# Altium footprint library PcbLib1.PcbLib: 31 footprints (part 1 of 2)
Each footprint in its own frame and in the unit in brackets; x right, y up, seen from the top. Pads: shape width x height; smd on the part's side, far side on the other; paste and mask are expansions set on the pad; w line width, h text height; cw(c..) or ccw(c..) is an arc to the next point about the centre after c.
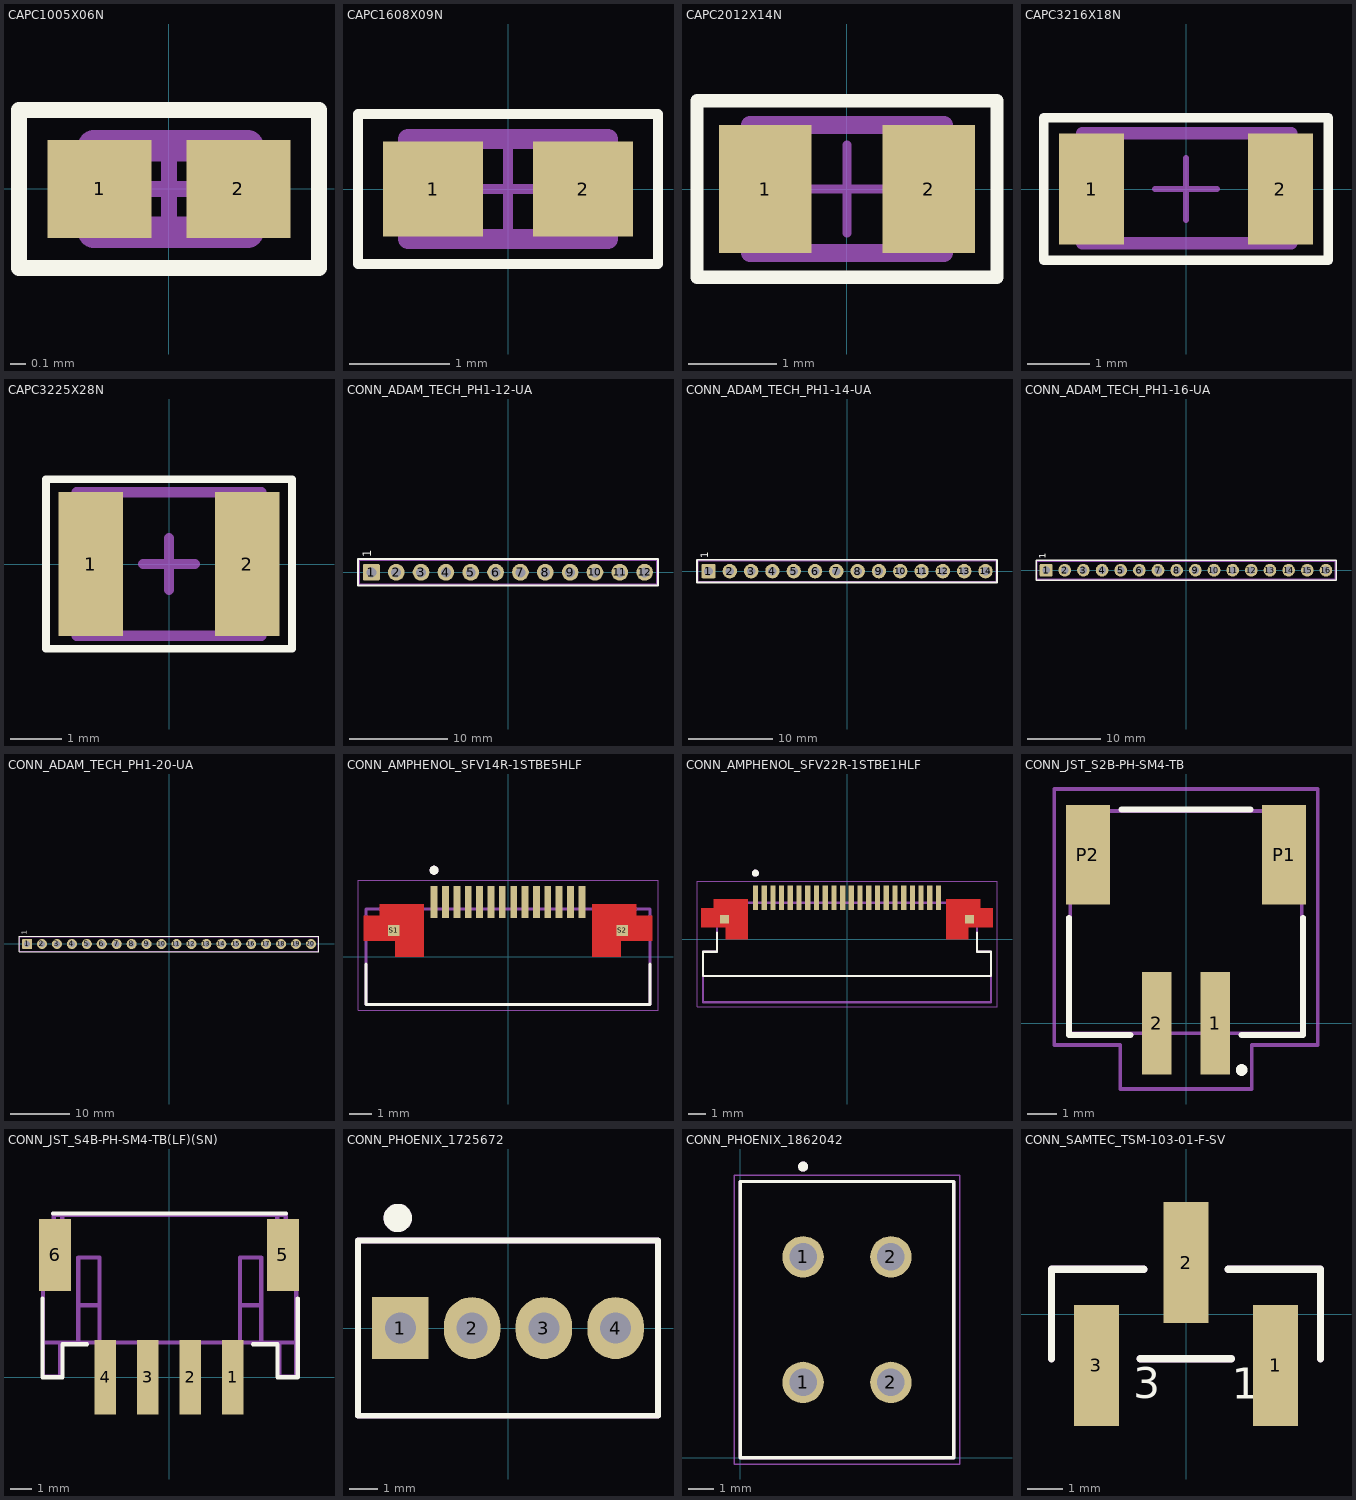
[diagram p0: the footprints below, top view; thin cyan lines are the x and y axes]

## CAPC1005X06N [mm] "Chip Capacitor, 2-Leads, Body 1.00x0.50mm, IPC Medium Density"
height 0.55
pads (2):
  rect 0.66x0.62 smd: 1(-0.44,0) 2(0.44,0)
Top Overlay:
  lines w0.1: -0.95,-0.5 -0.95,0.5 0.95,0.5 0.95,-0.5 -0.95,-0.5
Mechanical 15:
  lines w0.1: -0.275,0 0.275,0 ; 0,-0.275 0,0.275
Mechanical 17:
  lines w0.2: -0.475,-0.275 0.5,-0.275 0.5,0.275 -0.475,0.275 -0.475,-0.275
  text ".designator" at -0.9,0.8 h1.5
3D body "CAPC1005X06N.step": height 0.55, standoff 0, extent -0.525,-0.275 0.525,0.275

## CAPC1608X09N [mm] "Chip Capacitor, 2-Leads, Body 1.60x0.80mm, IPC Medium Density"
height 0.9
pads (2):
  rect 1x0.95 smd: 1(-0.75,0) 2(0.75,0)
Top Overlay:
  lines w0.1: -1.5,-0.75 -1.5,0.75 1.5,0.75 1.5,-0.75 -1.5,-0.75
Mechanical 15:
  lines w0.1: -0.45,0 0.45,0 ; 0,-0.45 0,0.45
Mechanical 17:
  lines w0.2: -1,-0.5 -1,0.5 1,0.5 1,-0.5 -1,-0.5
  text ".designator" at -1.5,1.1 h1.5
3D body: height 0.9, standoff 0, extent -0.45,-0.45 0.45,0.45
3D body: height 0.9, standoff 0, extent -0.85,-0.45 -0.45,0.45
3D body: height 0.9, standoff 0, extent 0.45,-0.45 0.85,0.45

## CAPC2012X14N [mm] "Chip Capacitor, 2-Leads, Body 2.00x1.25mm, IPC Medium Density"
height 1.45
pads (2):
  rect 1.05x1.45 smd: 1(-0.925,0) 2(0.925,0)
Top Overlay:
  lines w0.15: -1.7,-1 1.7,-1 1.7,1 -1.7,1 -1.7,-1
Mechanical 15:
  lines w0.1: -0.5,0 0.5,0 ; 0,-0.5 0,0.5
Mechanical 17:
  lines w0.2: -1.1,-0.725 -1.1,0.725 1.1,0.725 1.1,-0.725 -1.1,-0.725
  text ".designator" at -1.675,1.3 h1.5
3D body "CAPC2012X14N.step": height 1.45, standoff 0, extent -1.1,-0.725 1.1,0.725

## CAPC3216X18N [mm] "Chip Capacitor, 2-Leads, Body 3.20x1.60mm, IPC Medium Density"
height 1.8
pads (2):
  rect 1.05x1.8 smd: 1(-1.525,0) 2(1.525,0)
Top Overlay:
  lines w0.15: -2.3,-1.15 -2.3,1.15 2.3,1.15 2.3,-1.15 -2.3,-1.15
Mechanical 15:
  lines w0.1: -0.5,0 0.5,0 ; 0,-0.5 0,0.5
Mechanical 17:
  lines w0.2: -1.675,-0.875 -1.675,0.9 1.7,0.9 1.7,-0.875 -1.675,-0.875
  text ".designator" at -2.25,1.475 h1.5
3D body "CAPC3216X18N.step": height 1.8, standoff 0, extent -1.7,-0.9 1.7,0.9

## CAPC3225X28N [mm] "Chip Capacitor, 2-Leads, Body 3.20x2.50mm, IPC Medium Density"
height 2.8
pads (2):
  rect 1.25x2.8 smd: 1(-1.525,0) 2(1.525,0)
Top Overlay:
  lines w0.15: -2.4,-1.65 -2.4,1.65 2.4,1.65 2.4,-1.65 -2.4,-1.65
Mechanical 15:
  lines w0.2: -0.5,0 0.5,0 ; 0,-0.5 0,0.5
Mechanical 17:
  lines w0.2: -1.8,-1.4 -1.8,1.4 1.8,1.4 1.8,-1.4 -1.8,-1.4
  text ".designator" at -2.35,2.125 h1.5
3D body "CAPC3225X28N.step": height 2.8, standoff 0, extent -1.8,-1.4 1.8,1.4

## CONN_ADAM_TECH_PH1-12-UA [mm] "CONN_ADAM_TECH_PH1-12-UA"
height 12
pads (12):
  rrect20% 1.72x1.72 hole 1.02: 1(-13.97,0)
  round 1.72 hole 1.02: 2(-11.43,0) 3(-8.89,0) 4(-6.35,0) 5(-3.81,0) 6(-1.27,0) 7(1.27,0) 8(3.81,0) 9(6.35,0) 10(8.89,0) 11(11.43,0) 12(13.97,0)
Top Overlay:
  lines w0.2: -15.34,-1.35 -15.34,1.35 15.34,1.35 15.34,-1.35 -15.34,-1.35
  text "1" at -13.69,1.55 h1.5
Mechanical 17:
  lines w0.2: -15.24,-1.25 -15.24,1.25 15.23,1.25 15.23,-1.25 -15.24,-1.25
  text ".designator" at -11.67,2.04 h1.5
  text "1" at -13.69,1.55 h1.5
3D body "PH1-12-UA.STEP": height 7.25, standoff -4.3, extent -15.244,-1.25 15.244,1.25

## CONN_ADAM_TECH_PH1-14-UA [mm] "CONN_ADAM_TECH_PH1-14-UA"
height 12
pads (14):
  rrect20% 1.72x1.72 hole 1.02: 1(-16.51,0)
  round 1.72 hole 1.02: 2(-13.97,0) 3(-11.43,0) 4(-8.89,0) 5(-6.35,0) 6(-3.81,0) 7(-1.27,0) 8(1.27,0) 9(3.81,0) 10(6.35,0) 11(8.89,0) 12(11.43,0) 13(13.97,0) 14(16.51,0)
Top Overlay:
  lines w0.2: -17.88,-1.35 17.88,-1.35 17.88,1.35 -17.88,1.35 -17.88,-1.35
  text "1" at -16.23,1.55 h1.5
Mechanical 17:
  lines w0.2: -17.78,-1.25 17.8,-1.25 17.8,1.25 -17.78,1.25 -17.78,-1.25
  text "1" at -16.23,1.55 h1.5
  text ".designator" at 3.77,1.8 h1.5
3D body "PH1-14-UA.STEP": height 7.25, standoff -4.3, extent -17.784,-1.25 17.784,1.25

## CONN_ADAM_TECH_PH1-16-UA [mm] "CONN_ADAM_TECH_PH1-16-UA"
height 12
pads (16):
  rrect20% 1.72x1.72 hole 1.02: 1(-19.05,0)
  round 1.72 hole 1.02: 2(-16.51,0) 3(-13.97,0) 4(-11.43,0) 5(-8.89,0) 6(-6.35,0) 7(-3.81,0) 8(-1.27,0) 9(1.27,0) 10(3.81,0) 11(6.35,0) 12(8.89,0) 13(11.43,0) 14(13.97,0) 15(16.51,0) 16(19.05,0)
Top Overlay:
  lines w0.2: -20.42,-1.35 -20.42,1.35 20.42,1.35 20.42,-1.35 -20.42,-1.35
  text "1" at -18.77,1.55 h1.5
Mechanical 17:
  lines w0.2: -20.32,-1.25 -20.32,1.25 20.31,1.25 20.31,-1.25 -20.32,-1.25
  text ".designator" at 1.23,1.8 h1.5
  text "1" at -18.77,1.55 h1.5
3D body "PH1-16-UA.STEP": height 7.25, standoff -4.3, extent -20.324,-1.25 20.324,1.25

## CONN_ADAM_TECH_PH1-20-UA [mm] "CONN_ADAM_TECH_PH1-20-UA"
height 12
pads (20):
  rrect20% 1.72x1.72 hole 1.02: 1(-24.13,0)
  round 1.72 hole 1.02: 2(-21.59,0) 3(-19.05,0) 4(-16.51,0) 5(-13.97,0) 6(-11.43,0) 7(-8.89,0) 8(-6.35,0) 9(-3.81,0) 10(-1.27,0) 11(1.27,0) 12(3.81,0) 13(6.35,0) 14(8.89,0) 15(11.43,0) 16(13.97,0) 17(16.51,0) 18(19.05,0) 19(21.59,0) 20(24.13,0)
Top Overlay:
  lines w0.2: -25.5,-1.35 25.5,-1.35 25.5,1.35 -25.5,1.35 -25.5,-1.35
  text "1" at -23.85,1.55 h1.5
Mechanical 17:
  lines w0.2: -25.4,-1.25 25.4,-1.25 25.4,1.25 -25.4,1.25 -25.4,-1.25
  text "1" at -23.85,1.55 h1.5
  text ".designator" at -3.85,1.8 h1.5
3D body "CONN_ADAM_TECH_PH1-20-UA.STEP": height 8.5, standoff -3.05, extent -25.404,-1.245 25.404,1.255

## CONN_AMPHENOL_SFV14R-1STBE5HLF [mm] "CONN_AMPHENOL_SFV14R-1STBE5HLF"
height 2.36
pads (16):
  rect 0.3x1.4 smd: 1(-3.25,2.4) 2(-2.75,2.4) 3(-2.25,2.4) 4(-1.75,2.4) 5(-1.25,2.4) 6(-0.75,2.4) 7(-0.25,2.4) 8(0.25,2.4) 9(0.75,2.4) 10(1.25,2.4) 11(1.75,2.4) 12(2.25,2.4) 13(2.75,2.4) 14(3.25,2.4)
  rect 0.5x0.5 smd paste-1 mask+0: S1(-5.025,1.15) S2(5.025,1.15)
Top Layer:
  region: 5.65,1.8 6.35,1.8 6.35,0.7 4.95,0.7 4.95,0 3.7,0 3.7,2.3 5.65,2.3
  region: -3.7,0 -4.95,0 -4.95,0.7 -6.35,0.7 -6.35,1.8 -5.65,1.8 -5.65,2.3 -3.7,2.3
Top Overlay:
  circle w0.2: c-3.25,3.8 r0.1
  lines w0.127: -6.25,-0.32 -6.25,-2.1 6.25,-2.1 6.25,-0.32
Top Paste:
  region: -3.7,0 -4.95,0 -4.95,0.7 -6.35,0.7 -6.35,1.8 -5.65,1.8 -5.65,2.3 -3.7,2.3
  region: 5.65,1.8 6.35,1.8 6.35,0.7 4.95,0.7 4.95,0 3.7,0 3.7,2.3 5.65,2.3
Top Solder:
  region: 5.75,1.9 6.45,1.9 6.45,0.6 5.05,0.6 5.05,-0.1 3.6,-0.1 3.6,2.4 5.75,2.4
  region: -3.6,-0.1 -5.05,-0.1 -5.05,0.6 -6.45,0.6 -6.45,1.9 -5.75,1.9 -5.75,2.4 -3.6,2.4
Mechanical 13:
  circle w0.2: c-3.25,3.8 r0.1
  lines w0.127: -6.25,-2.1 6.25,-2.1 6.25,2.1 -6.25,2.1 -6.25,-2.1
Mechanical 15:
  lines w0.05: -6.6,-2.35 6.6,-2.35 6.6,3.35 -6.6,3.35 -6.6,-2.35
3D body "SFV14R-1STBE5HLF.STEP": height 2, standoff 0, extent -6.25,-2.04 6.25,2.86

## CONN_AMPHENOL_SFV22R-1STBE1HLF [mm] "CONN_AMPHENOL_SFV22R-1STBE1HLF"
height 2
pads (24):
  rect 0.3x1.4 smd mask+0.05: 1(-5.25,2.4) 2(-4.75,2.4) 3(-4.25,2.4) 4(-3.75,2.4) 5(-3.25,2.4) 6(-2.75,2.4) 7(-2.25,2.4) 8(-1.75,2.4) 9(-1.25,2.4) 10(-0.75,2.4) 11(-0.25,2.4) 12(0.25,2.4) 13(0.75,2.4) 14(1.25,2.4) 15(1.75,2.4) 16(2.25,2.4) 17(2.75,2.4) 18(3.25,2.4) 19(3.75,2.4) 20(4.25,2.4) 21(4.75,2.4) 22(5.25,2.4)
  rect 0.5x0.5 smd paste-1 mask+0: SH1(-7.025,1.15) SH2(7.025,1.15)
Top Layer:
  region: -5.7,0 -6.95,0 -6.95,0.7 -8.35,0.7 -8.35,1.8 -7.65,1.8 -7.65,2.3 -5.7,2.3
  region: 7.65,1.8 8.35,1.8 8.35,0.7 6.95,0.7 6.95,0 5.7,0 5.7,2.3 7.65,2.3
Top Overlay:
  circle w0.2: c-5.25,3.8 r0.1
  lines w0.127: -7.45,0.38 -7.45,-0.7 -8.25,-0.7 -8.25,-2.1 8.25,-2.1 8.25,-0.7 7.45,-0.7 7.45,0.38
Top Paste:
  region: 7.65,1.8 8.35,1.8 8.35,0.7 6.95,0.7 6.95,0 5.7,0 5.7,2.3 7.65,2.3
  region: -5.7,0 -6.95,0 -6.95,0.7 -8.35,0.7 -8.35,1.8 -7.65,1.8 -7.65,2.3 -5.7,2.3
Top Solder:
  region: -5.6,-0.1 -7.05,-0.1 -7.05,0.6 -8.45,0.6 -8.45,1.9 -7.75,1.9 -7.75,2.4 -5.6,2.4
  region: 7.75,1.9 8.45,1.9 8.45,0.6 7.05,0.6 7.05,-0.1 5.6,-0.1 5.6,2.4 7.75,2.4
Mechanical 13:
  circle w0.2: c-5.25,3.8 r0.1
  lines w0.127: -8.25,-2.1 -8.25,-0.7 -7.45,-0.7 -7.45,2.1 7.45,2.1 7.45,-0.7 8.25,-0.7 8.25,-2.1 ; -8.25,-2.1 8.25,-2.1 ; -8.25,-2.1 -8.25,-3.6 8.25,-3.6 8.25,-2.1
Mechanical 15:
  lines w0.05: -8.6,-3.85 -8.6,3.35 8.6,3.35 8.6,-3.85 -8.6,-3.85
3D body "step_temp.STEP": height 1.87, standoff 0, extent -8.25,-2.1 8.25,2.8

## CONN_JST_S2B-PH-SM4-TB [mm]
pads (4):
  rect 1x3.5 smd: 1(1,0) 2(-1,0)
  rect 1.5x3.4 smd: P1(3.35,5.75) P2(-3.35,5.75)
Top Overlay:
  circle w0.2: c1.9,-1.6 r0.1
  lines w0.2: -4,3.6 -4,-0.4 -1.9,-0.4 ; -2.2,7.3 2.2,7.3 ; 1.9,-0.4 4,-0.4 4,3.6
Mechanical 13:
  lines w0.127: -3.95,-0.35 -3.95,7.25 3.95,7.25 3.95,-0.35 -3.95,-0.35
Mechanical 15:
  lines w0.127: -4.5,-0.75 -4.5,8 4.5,8 4.5,-0.75 2.25,-0.75 2.25,-2.25 -2.25,-2.25 -2.25,-0.75 -4.5,-0.75
3D body "step_temp.STEP": height 5.5, standoff -0.1, extent -3.95,0 3.95,8.6

## CONN_JST_S4B-PH-SM4-TB(LF)(SN) [mm] "CONN_JST_S4B-PH-SM4-TB(LF)(SN)"
height 5.5
pads (6):
  rect 1x3.5 smd: 1(3,0) 2(1,0) 3(-1,0) 4(-3,0)
  rect 1.5x3.4 smd: 5(5.35,5.75) 6(-5.35,5.75)
Top Overlay:
  lines w0.2: -5.95,3.7 -5.95,0 -5,0 -5,1.55 -3.85,1.55 ; -5.45,7.7 5.5,7.7 ; 3.95,1.55 5.1,1.55 5.1,0 6.05,0 6.05,3.7
Mechanical 17:
  lines w0.2: -5.417,6.835 -5.417,7.635 -5.017,7.635 ; -5.117,1.635 -5.117,0.035 -5.917,0.035 -5.917,1.635 ; -4.267,3.385 -3.267,3.385 ; -3.217,1.635 -3.217,1.135 ; -2.717,1.635 -2.717,1.135 ; -1.217,1.635 -1.217,1.135 ; -0.717,1.635 -0.717,1.135 ; 0.783,1.635 0.783,1.135 ; 1.283,1.635 1.283,1.135 ; 2.783,1.635 2.783,1.135 ; 3.283,1.635 3.283,1.135 ; 3.333,3.385 4.333,3.385 ; 5.183,1.635 5.183,0.035 5.983,0.035 5.983,6.835 5.083,6.835 5.083,7.635 ; 5.483,6.835 5.483,7.635 5.083,7.635 ; 5.983,1.635 4.333,1.635 ; -5.917,1.635 -5.917,6.835 -5.017,6.835 -5.017,7.635 ; -5.917,1.635 -4.267,1.635 ; -5.017,7.635 5.083,7.635 ; -4.267,1.635 -3.267,1.635 ; -4.267,1.635 -4.267,5.635 -3.267,5.635 -3.267,1.635 ; -3.267,1.635 3.333,1.635 ; -3.217,1.035 -3.217,-0.965 -2.717,-0.965 -2.717,1.035 ; -3.217,1.035 -3.217,1.135 ; -3.217,1.035 -2.717,1.035 ; -3.217,1.135 -2.717,1.135 ; -2.717,1.035 -2.717,1.135 ; -1.217,1.035 -1.217,-0.965 -0.717,-0.965 ; -1.217,1.035 -1.217,1.135 ; -1.217,1.035 -0.717,1.035 ; -1.217,1.135 -0.717,1.135 ; -0.717,-0.965 -0.717,1.035 ; -0.717,-0.965 -0.717,1.035 ; -0.717,1.035 -0.717,1.135 ; 0.783,1.035 0.783,-0.965 1.283,-0.965 1.283,1.035 ; 0.783,1.035 0.783,1.135 ; 0.783,1.035 1.283,1.035 ; 0.783,1.135 1.283,1.135 ; 1.283,1.035 1.283,1.135 ; 2.783,1.035 2.783,-0.965 3.283,-0.965 3.283,1.035 ; 2.783,1.035 2.783,1.135 ; 2.783,1.035 3.283,1.035 ; 2.783,1.135 3.283,1.135 ; 3.283,1.035 3.283,1.135 ; 3.333,1.635 4.333,1.635 ; 3.333,1.635 3.333,5.635 4.333,5.635 4.333,1.635
  text ".designator" at -2.95,8.2 h1.5
3D body "CONN_JST_S4B-PH-SM4-TB.STEP": height 5.6, standoff 0, extent -5.95,-1 5.95,7.6

## CONN_PHOENIX_1725672 [mm] "CONN_PHOENIX_1725672"
height 8.5
pads (4):
  rect 2x2.2 hole 1.1: 1(-3.81,0)
  oval 2x2.2 hole 1.1: 2(-1.27,0) 3(1.27,0) 4(3.81,0)
Top Overlay:
  circle w0.6: c-3.9,3.9 r0.2
  lines w0.2: -5.31,-3.1 5.31,-3.1 5.31,3.1 -5.31,3.1 -5.31,-3.1
Mechanical 17:
  circle w0.6: c-3.9,3.9 r0.2
  lines w0.2: -5.31,-3.1 -5.31,3.1 5.31,3.1 5.31,-3.1 -5.31,-3.1
  text ".designator" at -3.1,-4.3 h1.5
3D body "CONN_PHOENIX_1725672.STEP": height 8.5, standoff -3.5, extent -5.38,-3.1 5.3,3.1

## CONN_PHOENIX_1862042 [mm] "CONN_PHOENIX_1862042"
height 10.2
pads (4):
  round 1.65 hole 1.1: 1(2.5,3) 1(2.5,8) 2(6,3) 2(6,8)
Top Overlay:
  circle w0.2: c2.5,11.6 r0.1
  lines w0.127: 0,0 8.5,0 8.5,11 0,11 0,0
Mechanical 13:
  circle w0.2: c2.5,11.6 r0.1
  lines w0.127: 0,0 8.5,0 8.5,11 0,11 0,0
Mechanical 15:
  lines w0.05: -0.25,-0.25 8.75,-0.25 8.75,11.25 -0.25,11.25 -0.25,-0.25
3D body "Phoenix_1862042.stp": height 10.2, standoff -2.6, extent 0,0 8.5,11

## CONN_SAMTEC_TSM-103-01-F-SV [mm] "CONN SAMTEC TSM-103-01-F-SV"
pads (3):
  rect 1.27x3.43 smd: 1(2.54,-1.46) 2(0,1.46) 3(-2.54,-1.46)
Top Overlay:
  lines w0.2: -3.81,-1.27 -3.81,1.27 -1.19,1.27 ; -1.31,-1.27 1.29,-1.27 ; 1.19,1.27 3.81,1.27 3.81,-1.27
  text "3" at -1.5,-2.683 h1.5
  text "1" at 1.3,-2.7 h1.5
Mechanical 17:
  lines w0.2: -3.81,-1.27 -3.81,1.27 -1.19,1.27 ; -1.31,-1.27 1.29,-1.27 ; 1.19,1.27 3.81,1.27 3.81,-1.27
  text ".designator" at -3.2,-4.4 h1.5
  text "1" at 1.3,-2.7 h1.5
  text "3" at -1.5,-2.683 h1.5
3D body "CONN_SAMTEC_tsm_103_01_f_sv.stp": height 9.65, standoff 0, extent -3.81,-2.642 3.81,2.642